# Altium footprint library Tienanh.PcbLib: 190 footprints (part 6 of 12)
Each footprint in its own frame and in the unit in brackets; x right, y up, seen from the top. Pads: shape width x height; smd on the part's side, far side on the other; paste and mask are expansions set on the pad; w line width, h text height; cw(c..) or ccw(c..) is an arc to the next point about the centre after c.
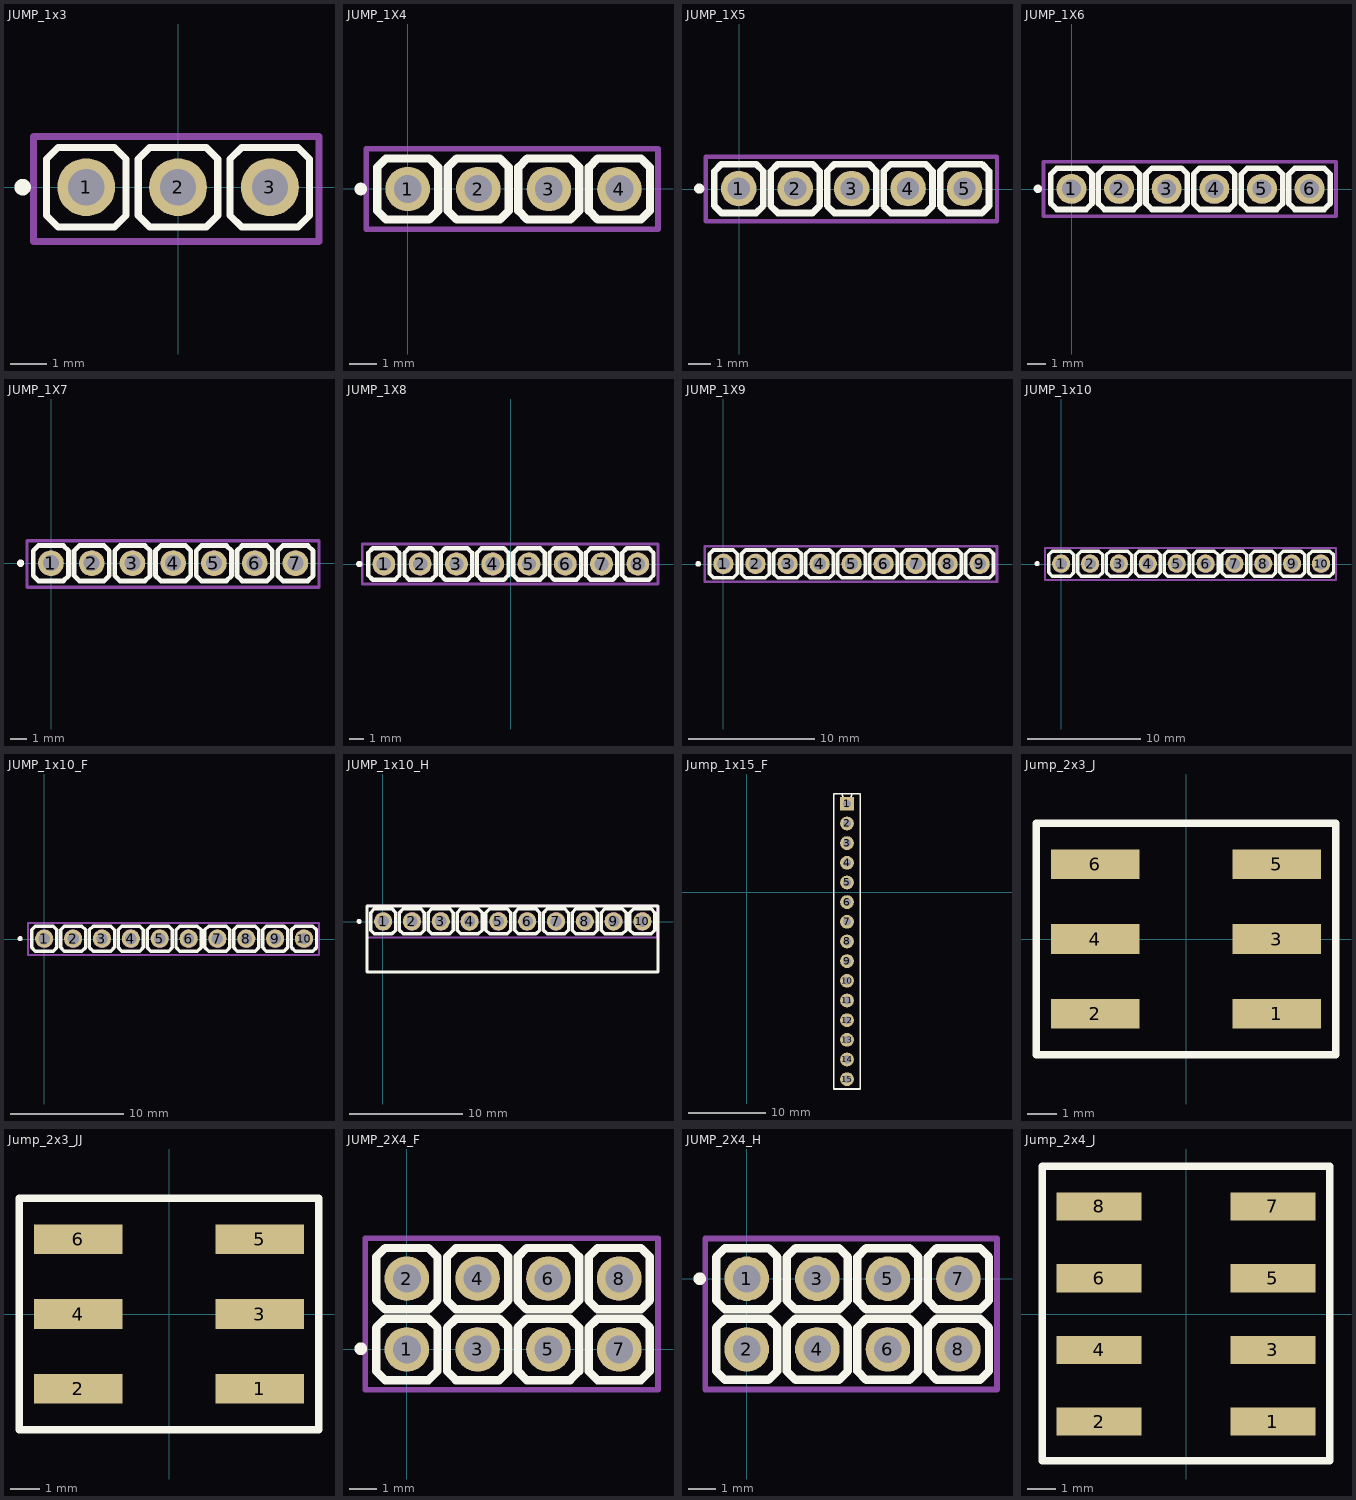
[diagram p5: the footprints below, top view; thin cyan lines are the x and y axes]

## JUMP_1x3 [mm] "JUMP_1x3_2P54"
pads (3):
  round 1.6 hole 1 mask+0.1: 1(-2.54,0) 2(0,0) 3(2.54,0)
Top Overlay:
  circle w0.254: c-4.3,0 r0.1
  lines w0.2: -3.64,-0.78 -3.32,-1.1 -1.76,-1.1 -1.44,-0.78 -1.44,0.78 -1.76,1.1 -3.32,1.1 -3.64,0.78 -3.64,-0.78 ; -1.1,-0.78 -0.78,-1.1 0.78,-1.1 1.1,-0.78 1.1,0.78 0.78,1.1 -0.78,1.1 -1.1,0.78 -1.1,-0.78 ; 1.44,-0.78 1.76,-1.1 3.32,-1.1 3.64,-0.78 3.64,0.78 3.32,1.1 1.76,1.1 1.44,0.78 1.44,-0.78
Mechanical 1:
  circle w0.05: c2.54,0 r0.762
  circle w0.05: c0,0 r0.762
  circle w0.05: c-2.54,0 r0.762
  lines w0.05: -3.64,-0.78 -3.64,0.78 -3.32,1.1 -1.76,1.1 -1.44,0.78 -1.44,-0.78 -1.76,-1.1 -3.32,-1.1 -3.64,-0.78 ; -1.1,-0.78 -1.1,0.78 -0.78,1.1 0.78,1.1 1.1,0.78 1.1,-0.78 0.78,-1.1 -0.78,-1.1 -1.1,-0.78 ; 1.44,-0.78 1.44,0.78 1.76,1.1 3.32,1.1 3.64,0.78 3.64,-0.78 3.32,-1.1 1.76,-1.1 1.44,-0.78
  text "1" at -2.64,-0.4 h0.8
  text "2" at -0.24,-0.4 h0.8
  text "3" at 2.26,-0.4 h0.8
Mechanical 15:
  lines w0.2: -4,-1.5 -4,1.4 3.9,1.4 3.9,-1.5 -4,-1.5
3D body "HEADER1.step": height 5.94, standoff -2.94, extent 1.24,-1.3 3.78,1.24
3D body "HEADER1.step": height 5.94, standoff -2.94, extent -1.3,-1.3 1.24,1.24
3D body "HEADER1.step": height 5.94, standoff -2.94, extent -3.84,-1.3 -1.3,1.24

## JUMP_1X4 [mm] "JUMP_1X4_2P54"
pads (4):
  round 1.6 hole 1 mask+0.1: 1(-0.01,-0.01) 2(2.53,-0.01) 3(5.07,-0.01) 4(7.61,-0.01)
Top Overlay:
  circle w0.254: c-1.7,-0.01 r0.1
  lines w0.3: -1.11,-0.79 -0.79,-1.11 0.77,-1.11 1.09,-0.79 1.09,0.77 0.77,1.09 -0.79,1.09 -1.11,0.77 -1.11,-0.79 ; 1.43,-0.79 1.75,-1.11 3.31,-1.11 3.63,-0.79 3.63,0.77 3.31,1.09 1.75,1.09 1.43,0.77 1.43,-0.79 ; 3.97,-0.79 4.29,-1.11 5.85,-1.11 6.17,-0.79 6.17,0.77 5.85,1.09 4.29,1.09 3.97,0.77 3.97,-0.79 ; 6.51,-0.79 6.83,-1.11 8.39,-1.11 8.71,-0.79 8.71,0.77 8.39,1.09 6.83,1.09 6.51,0.77 6.51,-0.79
Mechanical 1:
  circle w0.05: c7.61,-0.01 r0.762
  circle w0.05: c5.07,-0.01 r0.762
  circle w0.05: c2.53,-0.01 r0.762
  circle w0.05: c-0.01,-0.01 r0.762
  lines w0.05: -1.11,-0.79 -1.11,0.77 -0.79,1.09 0.77,1.09 1.09,0.77 1.09,-0.79 0.77,-1.11 -0.79,-1.11 -1.11,-0.79 ; 1.43,-0.79 1.43,0.77 1.75,1.09 3.31,1.09 3.63,0.77 3.63,-0.79 3.31,-1.11 1.75,-1.11 1.43,-0.79 ; 3.97,-0.79 3.97,0.77 4.29,1.09 5.85,1.09 6.17,0.77 6.17,-0.79 5.85,-1.11 4.29,-1.11 3.97,-0.79 ; 6.51,-0.79 6.51,0.77 6.83,1.09 8.39,1.09 8.71,0.77 8.71,-0.79 8.39,-1.11 6.83,-1.11 6.51,-0.79
  text "4" at 7.32,-0.37 h0.8
  text "3" at 4.82,-0.37 h0.8
  text "2" at 2.22,-0.37 h0.8
  text "1" at -0.18,-0.37 h0.8
Mechanical 15:
  lines w0.2: -1.5,-1.46 9,-1.46 9,1.44 -1.5,1.44 -1.5,-1.46
3D body "HEADER1.step": height 5.94, standoff -2.94, extent -1.31,-1.31 1.23,1.23
3D body "HEADER1.step": height 5.94, standoff -2.94, extent 1.23,-1.31 3.77,1.23
3D body "HEADER1.step": height 5.94, standoff -2.94, extent 6.31,-1.31 8.85,1.23
3D body "HEADER1.step": height 5.94, standoff -2.94, extent 3.77,-1.31 6.31,1.23

## JUMP_1X5 [mm] "JUMP_1X5_2P54"
pads (5):
  round 1.6 hole 1 mask+0.1: 1(-0.02,0.02) 2(2.52,0.02) 3(5.06,0.02) 4(7.6,0.02) 5(10.14,0.02)
Top Overlay:
  circle w0.254: c-1.8,0.02 r0.1
  lines w0.3: -1.12,-0.76 -1.12,0.8 -0.8,1.12 0.76,1.12 1.08,0.8 1.08,-0.76 0.76,-1.08 -0.8,-1.08 -1.12,-0.76 ; 1.42,-0.76 1.42,0.8 1.74,1.12 3.3,1.12 3.62,0.8 3.62,-0.76 3.3,-1.08 1.74,-1.08 1.42,-0.76 ; 3.96,-0.76 3.96,0.8 4.28,1.12 5.84,1.12 6.16,0.8 6.16,-0.76 5.84,-1.08 4.28,-1.08 3.96,-0.76 ; 6.5,-0.76 6.5,0.8 6.82,1.12 8.38,1.12 8.7,0.8 8.7,-0.76 8.38,-1.08 6.82,-1.08 6.5,-0.76 ; 9.04,-0.76 9.04,0.8 9.36,1.12 10.92,1.12 11.24,0.8 11.24,-0.76 10.92,-1.08 9.36,-1.08 9.04,-0.76
Mechanical 1:
  circle w0.05: c-0.02,0.02 r0.762
  circle w0.05: c2.52,0.02 r0.762
  circle w0.05: c5.06,0.02 r0.762
  circle w0.05: c7.6,0.02 r0.762
  circle w0.05: c10.14,0.02 r0.762
  lines w0.05: -1.12,-0.76 -0.8,-1.08 0.76,-1.08 1.08,-0.76 1.08,0.8 0.76,1.12 -0.8,1.12 -1.12,0.8 -1.12,-0.76 ; 1.42,-0.76 1.74,-1.08 3.3,-1.08 3.62,-0.76 3.62,0.8 3.3,1.12 1.74,1.12 1.42,0.8 1.42,-0.76 ; 3.96,-0.76 4.28,-1.08 5.84,-1.08 6.16,-0.76 6.16,0.8 5.84,1.12 4.28,1.12 3.96,0.8 3.96,-0.76 ; 6.5,-0.76 6.82,-1.08 8.38,-1.08 8.7,-0.76 8.7,0.8 8.38,1.12 6.82,1.12 6.5,0.8 6.5,-0.76 ; 9.04,-0.76 9.36,-1.08 10.92,-1.08 11.24,-0.76 11.24,0.8 10.92,1.12 9.36,1.12 9.04,0.8 9.04,-0.76
  text "4" at 7.26,-0.38 h0.8
  text "3" at 4.86,-0.38 h0.8
  text "2" at 2.28,-0.38 h0.8
  text "1" at -0.12,-0.38 h0.8
  text "5" at 9.88,-0.38 h0.8
Mechanical 15:
  lines w0.2: -1.5,-1.45 11.6,-1.45 11.6,1.45 -1.5,1.45 -1.5,-1.45
3D body "HEADER1.step": height 5.94, standoff -2.94, extent -1.32,-1.28 1.22,1.26
3D body "HEADER1.step": height 5.94, standoff -2.94, extent 1.22,-1.28 3.76,1.26
3D body "HEADER1.step": height 5.94, standoff -2.94, extent 3.76,-1.28 6.3,1.26
3D body "HEADER1.step": height 5.94, standoff -2.94, extent 6.3,-1.28 8.84,1.26
3D body "HEADER1.step": height 5.94, standoff -2.94, extent 8.84,-1.28 11.38,1.26

## JUMP_1X6 [mm] "JUMP_1X6_2P54"
pads (6):
  round 1.6 hole 1 mask+0.1: 1(-0.01,0.01) 2(2.53,0.01) 3(5.07,0.01) 4(7.61,0.01) 5(10.15,0.01) 6(12.69,0.01)
Top Overlay:
  circle w0.254: c-1.8,0.01 r0.1
  lines w0.3: -1.11,-0.77 -1.11,0.79 -0.79,1.11 0.77,1.11 1.09,0.79 1.09,-0.77 0.77,-1.09 -0.79,-1.09 -1.11,-0.77 ; 1.43,-0.77 1.43,0.79 1.75,1.11 3.31,1.11 3.63,0.79 3.63,-0.77 3.31,-1.09 1.75,-1.09 1.43,-0.77 ; 3.97,-0.77 3.97,0.79 4.29,1.11 5.85,1.11 6.17,0.79 6.17,-0.77 5.85,-1.09 4.29,-1.09 3.97,-0.77 ; 6.51,-0.77 6.51,0.79 6.83,1.11 8.39,1.11 8.71,0.79 8.71,-0.77 8.39,-1.09 6.83,-1.09 6.51,-0.77 ; 9.05,-0.77 9.05,0.79 9.37,1.11 10.93,1.11 11.25,0.79 11.25,-0.77 10.93,-1.09 9.37,-1.09 9.05,-0.77 ; 11.59,-0.77 11.59,0.79 11.91,1.11 13.47,1.11 13.79,0.79 13.79,-0.77 13.47,-1.09 11.91,-1.09 11.59,-0.77
Mechanical 1:
  circle w0.05: c12.69,0.01 r0.762
  circle w0.05: c10.15,0.01 r0.762
  circle w0.05: c7.61,0.01 r0.762
  circle w0.05: c5.07,0.01 r0.762
  circle w0.05: c2.53,0.01 r0.762
  circle w0.05: c-0.01,0.01 r0.762
  lines w0.05: -1.11,-0.77 -0.79,-1.09 0.77,-1.09 1.09,-0.77 1.09,0.79 0.77,1.11 -0.79,1.11 -1.11,0.79 -1.11,-0.77 ; 1.43,-0.77 1.75,-1.09 3.31,-1.09 3.63,-0.77 3.63,0.79 3.31,1.11 1.75,1.11 1.43,0.79 1.43,-0.77 ; 3.97,-0.77 4.29,-1.09 5.85,-1.09 6.17,-0.77 6.17,0.79 5.85,1.11 4.29,1.11 3.97,0.79 3.97,-0.77 ; 6.51,-0.77 6.83,-1.09 8.39,-1.09 8.71,-0.77 8.71,0.79 8.39,1.11 6.83,1.11 6.51,0.79 6.51,-0.77 ; 9.05,-0.77 9.37,-1.09 10.93,-1.09 11.25,-0.77 11.25,0.79 10.93,1.11 9.37,1.11 9.05,0.79 9.05,-0.77 ; 11.59,-0.77 11.91,-1.09 13.47,-1.09 13.79,-0.77 13.79,0.79 13.47,1.11 11.91,1.11 11.59,0.79 11.59,-0.77
  text "5" at 9.91,-0.36 h0.8
  text "1" at -0.17,-0.36 h0.8
  text "2" at 2.23,-0.36 h0.8
  text "3" at 4.81,-0.36 h0.8
  text "4" at 7.31,-0.36 h0.8
  text "6" at 12.38,-0.41 h0.8
Mechanical 15:
  lines w0.2: -1.5,-1.45 -1.5,1.45 14.1,1.45 14.1,-1.45 -1.5,-1.45
3D body "HEADER1.step": height 5.94, standoff -2.94, extent 11.39,-1.29 13.93,1.25
3D body "HEADER1.step": height 5.94, standoff -2.94, extent 8.85,-1.29 11.39,1.25
3D body "HEADER1.step": height 5.94, standoff -2.94, extent 6.31,-1.29 8.85,1.25
3D body "HEADER1.step": height 5.94, standoff -2.94, extent 3.77,-1.29 6.31,1.25
3D body "HEADER1.step": height 5.94, standoff -2.94, extent 1.23,-1.29 3.77,1.25
3D body "HEADER1.step": height 5.94, standoff -2.94, extent -1.31,-1.29 1.23,1.25

## JUMP_1X7 [mm] "JUMP_1X7_2P54"
pads (7):
  round 1.6 hole 1 mask+0.1: 1(-0.01,0) 2(2.53,0) 3(5.07,0) 4(7.61,0) 5(10.15,0) 6(12.69,0) 7(15.23,0)
Top Overlay:
  circle w0.254: c-1.9,0 r0.1
  lines w0.3: -1.11,-0.78 -1.11,0.78 -0.79,1.1 0.77,1.1 1.09,0.78 1.09,-0.78 0.77,-1.1 -0.79,-1.1 -1.11,-0.78 ; 1.43,-0.78 1.43,0.78 1.75,1.1 3.31,1.1 3.63,0.78 3.63,-0.78 3.31,-1.1 1.75,-1.1 1.43,-0.78 ; 3.97,-0.78 3.97,0.78 4.29,1.1 5.85,1.1 6.17,0.78 6.17,-0.78 5.85,-1.1 4.29,-1.1 3.97,-0.78 ; 6.51,-0.78 6.51,0.78 6.83,1.1 8.39,1.1 8.71,0.78 8.71,-0.78 8.39,-1.1 6.83,-1.1 6.51,-0.78 ; 9.05,-0.78 9.05,0.78 9.37,1.1 10.93,1.1 11.25,0.78 11.25,-0.78 10.93,-1.1 9.37,-1.1 9.05,-0.78 ; 11.59,-0.78 11.59,0.78 11.91,1.1 13.47,1.1 13.79,0.78 13.79,-0.78 13.47,-1.1 11.91,-1.1 11.59,-0.78 ; 14.13,-0.78 14.13,0.78 14.45,1.1 16.01,1.1 16.33,0.78 16.33,-0.78 16.01,-1.1 14.45,-1.1 14.13,-0.78
Mechanical 1:
  circle w0.05: c-0.01,0 r0.762
  circle w0.05: c2.53,0 r0.762
  circle w0.05: c5.07,0 r0.762
  circle w0.05: c7.61,0 r0.762
  circle w0.05: c10.15,0 r0.762
  circle w0.05: c12.69,0 r0.762
  circle w0.05: c15.23,0 r0.762
  lines w0.05: -1.11,-0.78 -0.79,-1.1 0.77,-1.1 1.09,-0.78 1.09,0.78 0.77,1.1 -0.79,1.1 -1.11,0.78 -1.11,-0.78 ; 1.43,-0.78 1.75,-1.1 3.31,-1.1 3.63,-0.78 3.63,0.78 3.31,1.1 1.75,1.1 1.43,0.78 1.43,-0.78 ; 3.97,-0.78 4.29,-1.1 5.85,-1.1 6.17,-0.78 6.17,0.78 5.85,1.1 4.29,1.1 3.97,0.78 3.97,-0.78 ; 6.51,-0.78 6.83,-1.1 8.39,-1.1 8.71,-0.78 8.71,0.78 8.39,1.1 6.83,1.1 6.51,0.78 6.51,-0.78 ; 9.05,-0.78 9.37,-1.1 10.93,-1.1 11.25,-0.78 11.25,0.78 10.93,1.1 9.37,1.1 9.05,0.78 9.05,-0.78 ; 11.59,-0.78 11.91,-1.1 13.47,-1.1 13.79,-0.78 13.79,0.78 13.47,1.1 11.91,1.1 11.59,0.78 11.59,-0.78 ; 14.13,-0.78 14.45,-1.1 16.01,-1.1 16.33,-0.78 16.33,0.78 16.01,1.1 14.45,1.1 14.13,0.78 14.13,-0.78
  text "7" at 15.05,-0.5 h0.8
  text "5" at 9.95,-0.4 h0.8
  text "1" at -0.13,-0.4 h0.8
  text "2" at 2.27,-0.4 h0.8
  text "3" at 4.85,-0.4 h0.8
  text "4" at 7.35,-0.4 h0.8
  text "6" at 12.42,-0.45 h0.8
Mechanical 15:
  lines w0.2: -1.5,-1.5 16.7,-1.5 16.7,1.4 -1.5,1.4 -1.5,-1.5
3D body "HEADER1.step": height 5.94, standoff -2.94, extent -1.31,-1.3 1.23,1.24
3D body "HEADER1.step": height 5.94, standoff -2.94, extent 1.23,-1.3 3.77,1.24
3D body "HEADER1.step": height 5.94, standoff -2.94, extent 3.77,-1.3 6.31,1.24
3D body "HEADER1.step": height 5.94, standoff -2.94, extent 6.31,-1.3 8.85,1.24
3D body "HEADER1.step": height 5.94, standoff -2.94, extent 8.85,-1.3 11.39,1.24
3D body "HEADER1.step": height 5.94, standoff -2.94, extent 11.39,-1.3 13.93,1.24
3D body "HEADER1.step": height 5.94, standoff -2.94, extent 13.93,-1.3 16.47,1.24

## JUMP_1X8 [mm] "JUMP_1X8_2P54"
pads (8):
  round 1.6 hole 1 mask+0.1: 1(-8.89,0) 2(-6.35,0) 3(-3.81,0) 4(-1.27,0) 5(1.27,0) 6(3.81,0) 7(6.35,0) 8(8.89,0)
Top Overlay:
  circle w0.254: c-10.6,0 r0.1
  lines w0.3: -9.99,-0.78 -9.99,0.78 -9.67,1.1 -8.11,1.1 -7.79,0.78 -7.79,-0.78 -8.11,-1.1 -9.67,-1.1 -9.99,-0.78 ; -7.45,-0.78 -7.45,0.78 -7.13,1.1 -5.57,1.1 -5.25,0.78 -5.25,-0.78 -5.57,-1.1 -7.13,-1.1 -7.45,-0.78 ; -4.91,-0.78 -4.91,0.78 -4.59,1.1 -3.03,1.1 -2.71,0.78 -2.71,-0.78 -3.03,-1.1 -4.59,-1.1 -4.91,-0.78 ; -2.37,-0.78 -2.37,0.78 -2.05,1.1 -0.49,1.1 -0.17,0.78 -0.17,-0.78 -0.49,-1.1 -2.05,-1.1 -2.37,-0.78 ; 0.17,-0.78 0.17,0.78 0.49,1.1 2.05,1.1 2.37,0.78 2.37,-0.78 2.05,-1.1 0.49,-1.1 0.17,-0.78 ; 2.71,-0.78 2.71,0.78 3.03,1.1 4.59,1.1 4.91,0.78 4.91,-0.78 4.59,-1.1 3.03,-1.1 2.71,-0.78 ; 5.25,-0.78 5.25,0.78 5.57,1.1 7.13,1.1 7.45,0.78 7.45,-0.78 7.13,-1.1 5.57,-1.1 5.25,-0.78 ; 7.79,-0.78 7.79,0.78 8.11,1.1 9.67,1.1 9.99,0.78 9.99,-0.78 9.67,-1.1 8.11,-1.1 7.79,-0.78
Mechanical 1:
  circle w0.05: c8.89,0 r0.762
  circle w0.05: c6.35,0 r0.762
  circle w0.05: c3.81,0 r0.762
  circle w0.05: c1.27,0 r0.762
  circle w0.05: c-1.27,0 r0.762
  circle w0.05: c-3.81,0 r0.762
  circle w0.05: c-6.35,0 r0.762
  circle w0.05: c-8.89,0 r0.762
  lines w0.05: -9.99,-0.78 -9.67,-1.1 -8.11,-1.1 -7.79,-0.78 -7.79,0.78 -8.11,1.1 -9.67,1.1 -9.99,0.78 -9.99,-0.78 ; -7.45,-0.78 -7.13,-1.1 -5.57,-1.1 -5.25,-0.78 -5.25,0.78 -5.57,1.1 -7.13,1.1 -7.45,0.78 -7.45,-0.78 ; -4.91,-0.78 -4.59,-1.1 -3.03,-1.1 -2.71,-0.78 -2.71,0.78 -3.03,1.1 -4.59,1.1 -4.91,0.78 -4.91,-0.78 ; -2.37,-0.78 -2.05,-1.1 -0.49,-1.1 -0.17,-0.78 -0.17,0.78 -0.49,1.1 -2.05,1.1 -2.37,0.78 -2.37,-0.78 ; 0.17,-0.78 0.49,-1.1 2.05,-1.1 2.37,-0.78 2.37,0.78 2.05,1.1 0.49,1.1 0.17,0.78 0.17,-0.78 ; 2.71,-0.78 3.03,-1.1 4.59,-1.1 4.91,-0.78 4.91,0.78 4.59,1.1 3.03,1.1 2.71,0.78 2.71,-0.78 ; 5.25,-0.78 5.57,-1.1 7.13,-1.1 7.45,-0.78 7.45,0.78 7.13,1.1 5.57,1.1 5.25,0.78 5.25,-0.78 ; 7.79,-0.78 8.11,-1.1 9.67,-1.1 9.99,-0.78 9.99,0.78 9.67,1.1 8.11,1.1 7.79,0.78 7.79,-0.78
  text "6" at 3.54,-0.45 h0.8
  text "4" at -1.53,-0.4 h0.8
  text "3" at -4.03,-0.4 h0.8
  text "2" at -6.61,-0.4 h0.8
  text "1" at -9.01,-0.4 h0.8
  text "5" at 1.07,-0.4 h0.8
  text "7" at 6.17,-0.45 h0.8
  text "8" at 8.57,-0.5 h0.8
Mechanical 15:
  lines w0.2: -10.4,-1.4 -10.4,1.4 10.3,1.4 10.3,-1.4 -10.4,-1.4
3D body "HEADER1.step": height 5.94, standoff -2.94, extent 7.59,-1.3 10.13,1.24
3D body "HEADER1.step": height 5.94, standoff -2.94, extent 5.05,-1.3 7.59,1.24
3D body "HEADER1.step": height 5.94, standoff -2.94, extent 2.51,-1.3 5.05,1.24
3D body "HEADER1.step": height 5.94, standoff -2.94, extent -0.03,-1.3 2.51,1.24
3D body "HEADER1.step": height 5.94, standoff -2.94, extent -2.57,-1.3 -0.03,1.24
3D body "HEADER1.step": height 5.94, standoff -2.94, extent -5.11,-1.3 -2.57,1.24
3D body "HEADER1.step": height 5.94, standoff -2.94, extent -7.65,-1.3 -5.11,1.24
3D body "HEADER1.step": height 5.94, standoff -2.94, extent -10.19,-1.3 -7.65,1.24

## JUMP_1X9 [mm] "JUMP_1X9_2P54"
pads (9):
  round 1.6 hole 1 mask+0.1: 1(0,0.01) 2(2.54,0.01) 3(5.08,0.01) 4(7.62,0.01) 5(10.16,0.01) 6(12.7,0.01) 7(15.24,0.01) 8(17.78,0.01) 9(20.32,0.01)
Top Overlay:
  circle w0.254: c-2,0.01 r0.1
  lines w0.3: -1.1,-0.77 -1.1,0.79 -0.78,1.11 0.78,1.11 1.1,0.79 1.1,-0.77 0.78,-1.09 -0.78,-1.09 -1.1,-0.77 ; 1.44,-0.77 1.44,0.79 1.76,1.11 3.32,1.11 3.64,0.79 3.64,-0.77 3.32,-1.09 1.76,-1.09 1.44,-0.77 ; 3.98,-0.77 3.98,0.79 4.3,1.11 5.86,1.11 6.18,0.79 6.18,-0.77 5.86,-1.09 4.3,-1.09 3.98,-0.77 ; 6.52,-0.77 6.52,0.79 6.84,1.11 8.4,1.11 8.72,0.79 8.72,-0.77 8.4,-1.09 6.84,-1.09 6.52,-0.77 ; 9.06,-0.77 9.06,0.79 9.38,1.11 10.94,1.11 11.26,0.79 11.26,-0.77 10.94,-1.09 9.38,-1.09 9.06,-0.77 ; 11.6,-0.77 11.6,0.79 11.92,1.11 13.48,1.11 13.8,0.79 13.8,-0.77 13.48,-1.09 11.92,-1.09 11.6,-0.77 ; 14.14,-0.77 14.14,0.79 14.46,1.11 16.02,1.11 16.34,0.79 16.34,-0.77 16.02,-1.09 14.46,-1.09 14.14,-0.77 ; 16.68,-0.77 16.68,0.79 17,1.11 18.56,1.11 18.88,0.79 18.88,-0.77 18.56,-1.09 17,-1.09 16.68,-0.77 ; 19.22,-0.77 19.22,0.79 19.54,1.11 21.1,1.11 21.42,0.79 21.42,-0.77 21.1,-1.09 19.54,-1.09 19.22,-0.77
Mechanical 1:
  circle w0.05: c0,0.01 r0.762
  circle w0.05: c2.54,0.01 r0.762
  circle w0.05: c5.08,0.01 r0.762
  circle w0.05: c7.62,0.01 r0.762
  circle w0.05: c10.16,0.01 r0.762
  circle w0.05: c12.7,0.01 r0.762
  circle w0.05: c15.24,0.01 r0.762
  circle w0.05: c17.78,0.01 r0.762
  circle w0.05: c20.32,0.01 r0.762
  lines w0.05: -1.1,-0.77 -0.78,-1.09 0.78,-1.09 1.1,-0.77 1.1,0.79 0.78,1.11 -0.78,1.11 -1.1,0.79 -1.1,-0.77 ; 1.44,-0.77 1.76,-1.09 3.32,-1.09 3.64,-0.77 3.64,0.79 3.32,1.11 1.76,1.11 1.44,0.79 1.44,-0.77 ; 3.98,-0.77 4.3,-1.09 5.86,-1.09 6.18,-0.77 6.18,0.79 5.86,1.11 4.3,1.11 3.98,0.79 3.98,-0.77 ; 6.52,-0.77 6.84,-1.09 8.4,-1.09 8.72,-0.77 8.72,0.79 8.4,1.11 6.84,1.11 6.52,0.79 6.52,-0.77 ; 9.06,-0.77 9.38,-1.09 10.94,-1.09 11.26,-0.77 11.26,0.79 10.94,1.11 9.38,1.11 9.06,0.79 9.06,-0.77 ; 11.6,-0.77 11.92,-1.09 13.48,-1.09 13.8,-0.77 13.8,0.79 13.48,1.11 11.92,1.11 11.6,0.79 11.6,-0.77 ; 14.14,-0.77 14.46,-1.09 16.02,-1.09 16.34,-0.77 16.34,0.79 16.02,1.11 14.46,1.11 14.14,0.79 14.14,-0.77 ; 16.68,-0.77 17,-1.09 18.56,-1.09 18.88,-0.77 18.88,0.79 18.56,1.11 17,1.11 16.68,0.79 16.68,-0.77 ; 19.22,-0.77 19.54,-1.09 21.1,-1.09 21.42,-0.77 21.42,0.79 21.1,1.11 19.54,1.11 19.22,0.79 19.22,-0.77
  text "7" at 15.06,-0.49 h0.8
  text "5" at 9.96,-0.39 h0.8
  text "1" at -0.12,-0.39 h0.8
  text "2" at 2.28,-0.39 h0.8
  text "3" at 4.86,-0.39 h0.8
  text "4" at 7.36,-0.39 h0.8
  text "6" at 12.43,-0.44 h0.8
  text "8" at 17.46,-1.49 h0.8
  text "9" at 20.06,-0.39 h0.8
Mechanical 15:
  lines w0.2: -1.5,-1.4 -1.5,1.4 21.7,1.4 21.7,-1.4 -1.5,-1.4
3D body "HEADER1.step": height 5.94, standoff -2.94, extent -1.3,-1.29 1.24,1.25
3D body "HEADER1.step": height 5.94, standoff -2.94, extent 1.24,-1.29 3.78,1.25
3D body "HEADER1.step": height 5.94, standoff -2.94, extent 3.78,-1.29 6.32,1.25
3D body "HEADER1.step": height 5.94, standoff -2.94, extent 6.32,-1.29 8.86,1.25
3D body "HEADER1.step": height 5.94, standoff -2.94, extent 8.86,-1.29 11.4,1.25
3D body "HEADER1.step": height 5.94, standoff -2.94, extent 11.4,-1.29 13.94,1.25
3D body "HEADER1.step": height 5.94, standoff -2.94, extent 13.94,-1.29 16.48,1.25
3D body "HEADER1.step": height 5.94, standoff -2.94, extent 16.48,-1.29 19.02,1.25
3D body "HEADER1.step": height 5.94, standoff -2.94, extent 19.02,-1.29 21.56,1.25

## JUMP_1x10 [mm] "JUMP_1x10_2P54"
pads (10):
  round 1.6 hole 1 mask+0.1: 1(0.02,0.03) 2(2.56,0.03) 3(5.1,0.03) 4(7.64,0.03) 5(10.18,0.03) 6(12.72,0.03) 7(15.26,0.03) 8(17.8,0.03) 9(20.34,0.03) 10(22.88,0.03)
Top Overlay:
  circle w0.254: c-2.1,0.03 r0.1
  lines w0.3: -1.08,-0.75 -1.08,0.81 -0.76,1.13 0.8,1.13 1.12,0.81 1.12,-0.75 0.8,-1.07 -0.76,-1.07 -1.08,-0.75 ; 1.46,-0.75 1.46,0.81 1.78,1.13 3.34,1.13 3.66,0.81 3.66,-0.75 3.34,-1.07 1.78,-1.07 1.46,-0.75 ; 4,-0.75 4,0.81 4.32,1.13 5.88,1.13 6.2,0.81 6.2,-0.75 5.88,-1.07 4.32,-1.07 4,-0.75 ; 6.54,-0.75 6.54,0.81 6.86,1.13 8.42,1.13 8.74,0.81 8.74,-0.75 8.42,-1.07 6.86,-1.07 6.54,-0.75 ; 9.08,-0.75 9.08,0.81 9.4,1.13 10.96,1.13 11.28,0.81 11.28,-0.75 10.96,-1.07 9.4,-1.07 9.08,-0.75 ; 11.62,-0.75 11.62,0.81 11.94,1.13 13.5,1.13 13.82,0.81 13.82,-0.75 13.5,-1.07 11.94,-1.07 11.62,-0.75 ; 14.16,-0.75 14.16,0.81 14.48,1.13 16.04,1.13 16.36,0.81 16.36,-0.75 16.04,-1.07 14.48,-1.07 14.16,-0.75 ; 16.7,-0.75 16.7,0.81 17.02,1.13 18.58,1.13 18.9,0.81 18.9,-0.75 18.58,-1.07 17.02,-1.07 16.7,-0.75 ; 19.24,-0.75 19.24,0.81 19.56,1.13 21.12,1.13 21.44,0.81 21.44,-0.75 21.12,-1.07 19.56,-1.07 19.24,-0.75 ; 21.78,-0.75 21.78,0.81 22.1,1.13 23.66,1.13 23.98,0.81 23.98,-0.75 23.66,-1.07 22.1,-1.07 21.78,-0.75
Mechanical 1:
  circle w0.05: c22.88,0.03 r0.762
  circle w0.05: c20.34,0.03 r0.762
  circle w0.05: c17.8,0.03 r0.762
  circle w0.05: c15.26,0.03 r0.762
  circle w0.05: c12.72,0.03 r0.762
  circle w0.05: c10.18,0.03 r0.762
  circle w0.05: c7.64,0.03 r0.762
  circle w0.05: c5.1,0.03 r0.762
  circle w0.05: c2.56,0.03 r0.762
  circle w0.05: c0.02,0.03 r0.762
  lines w0.05: -1.08,-0.75 -0.76,-1.07 0.8,-1.07 1.12,-0.75 1.12,0.81 0.8,1.13 -0.76,1.13 -1.08,0.81 ; 1.46,-0.75 1.78,-1.07 3.34,-1.07 3.66,-0.75 3.66,0.81 3.34,1.13 1.78,1.13 1.46,0.81 1.46,-0.75 ; 4,-0.75 4.32,-1.07 5.88,-1.07 6.2,-0.75 6.2,0.81 5.88,1.13 4.32,1.13 4,0.81 4,-0.75 ; 6.54,-0.75 6.86,-1.07 8.42,-1.07 8.74,-0.75 8.74,0.81 8.42,1.13 6.86,1.13 6.54,0.81 6.54,-0.75 ; 9.08,-0.75 9.4,-1.07 10.96,-1.07 11.28,-0.75 11.28,0.81 10.96,1.13 9.4,1.13 9.08,0.81 9.08,-0.75 ; 11.62,-0.75 11.94,-1.07 13.5,-1.07 13.82,-0.75 13.82,0.81 13.5,1.13 11.94,1.13 11.62,0.81 11.62,-0.75 ; 14.16,-0.75 14.48,-1.07 16.04,-1.07 16.36,-0.75 16.36,0.81 16.04,1.13 14.48,1.13 14.16,0.81 14.16,-0.75 ; 16.7,-0.75 17.02,-1.07 18.58,-1.07 18.9,-0.75 18.9,0.81 18.58,1.13 17.02,1.13 16.7,0.81 16.7,-0.75 ; 19.24,-0.75 19.56,-1.07 21.12,-1.07 21.44,-0.75 21.44,0.81 21.12,1.13 19.56,1.13 19.24,0.81 19.24,-0.75 ; 21.78,-0.75 22.1,-1.07 23.66,-1.07 23.98,-0.75 23.98,0.81 23.66,1.13 22.1,1.13 21.78,0.81 21.78,-0.75
  text "7" at 15.08,-0.47 h0.8
  text "5" at 9.98,-0.37 h0.8
  text "1" at -0.1,-0.37 h0.8
  text "2" at 2.3,-0.37 h0.8
  text "3" at 4.88,-0.37 h0.8
  text "4" at 7.38,-0.37 h0.8
  text "6" at 12.45,-0.42 h0.8
  text "9" at 20.08,-0.47 h0.8
  text "8" at 17.48,-1.57 h0.8
  text "10" at 22.38,-0.27 h0.6
Mechanical 15:
  lines w0.2: -1.4,-1.4 -1.4,1.4 24.2,1.4 24.2,-1.4 -1.4,-1.4
3D body "HEADER1.step": height 5.94, standoff -2.94, extent 21.58,-1.27 24.12,1.27
3D body "HEADER1.step": height 5.94, standoff -2.94, extent 19.04,-1.27 21.58,1.27
3D body "HEADER1.step": height 5.94, standoff -2.94, extent 16.5,-1.27 19.04,1.27
3D body "HEADER1.step": height 5.94, standoff -2.94, extent 13.96,-1.27 16.5,1.27
3D body "HEADER1.step": height 5.94, standoff -2.94, extent 11.42,-1.27 13.96,1.27
3D body "HEADER1.step": height 5.94, standoff -2.94, extent 8.88,-1.27 11.42,1.27
3D body "HEADER1.step": height 5.94, standoff -2.94, extent 6.34,-1.27 8.88,1.27
3D body "HEADER1.step": height 5.94, standoff -2.94, extent 3.8,-1.27 6.34,1.27
3D body "HEADER1.step": height 5.94, standoff -2.94, extent 1.26,-1.27 3.8,1.27
3D body "HEADER1.step": height 5.94, standoff -2.94, extent -1.28,-1.27 1.26,1.27

## JUMP_1x10_F [mm] "JUMP_1x10_2P54"
pads (10):
  round 1.6 hole 1 mask+0.1: 1(0.02,0.03) 2(2.56,0.03) 3(5.1,0.03) 4(7.64,0.03) 5(10.18,0.03) 6(12.72,0.03) 7(15.26,0.03) 8(17.8,0.03) 9(20.34,0.03) 10(22.88,0.03)
Top Overlay:
  circle w0.254: c-2.1,0.03 r0.1
  lines w0.3: -1.08,-0.75 -0.76,-1.07 0.8,-1.07 1.12,-0.75 1.12,0.81 0.8,1.13 -0.76,1.13 -1.08,0.81 -1.08,-0.75 ; 1.46,-0.75 1.78,-1.07 3.34,-1.07 3.66,-0.75 3.66,0.81 3.34,1.13 1.78,1.13 1.46,0.81 1.46,-0.75 ; 4,-0.75 4.32,-1.07 5.88,-1.07 6.2,-0.75 6.2,0.81 5.88,1.13 4.32,1.13 4,0.81 4,-0.75 ; 6.54,-0.75 6.86,-1.07 8.42,-1.07 8.74,-0.75 8.74,0.81 8.42,1.13 6.86,1.13 6.54,0.81 6.54,-0.75 ; 9.08,-0.75 9.4,-1.07 10.96,-1.07 11.28,-0.75 11.28,0.81 10.96,1.13 9.4,1.13 9.08,0.81 9.08,-0.75 ; 11.62,-0.75 11.94,-1.07 13.5,-1.07 13.82,-0.75 13.82,0.81 13.5,1.13 11.94,1.13 11.62,0.81 11.62,-0.75 ; 14.16,-0.75 14.48,-1.07 16.04,-1.07 16.36,-0.75 16.36,0.81 16.04,1.13 14.48,1.13 14.16,0.81 14.16,-0.75 ; 16.7,-0.75 17.02,-1.07 18.58,-1.07 18.9,-0.75 18.9,0.81 18.58,1.13 17.02,1.13 16.7,0.81 16.7,-0.75 ; 19.24,-0.75 19.56,-1.07 21.12,-1.07 21.44,-0.75 21.44,0.81 21.12,1.13 19.56,1.13 19.24,0.81 19.24,-0.75 ; 21.78,-0.75 22.1,-1.07 23.66,-1.07 23.98,-0.75 23.98,0.81 23.66,1.13 22.1,1.13 21.78,0.81 21.78,-0.75
Mechanical 1:
  circle w0.05: c0.02,0.03 r0.762
  circle w0.05: c2.56,0.03 r0.762
  circle w0.05: c5.1,0.03 r0.762
  circle w0.05: c7.64,0.03 r0.762
  circle w0.05: c10.18,0.03 r0.762
  circle w0.05: c12.72,0.03 r0.762
  circle w0.05: c15.26,0.03 r0.762
  circle w0.05: c17.8,0.03 r0.762
  circle w0.05: c20.34,0.03 r0.762
  circle w0.05: c22.88,0.03 r0.762
  lines w0.05: -1.08,-0.75 -0.76,-1.07 0.8,-1.07 1.12,-0.75 1.12,0.81 0.8,1.13 -0.76,1.13 -1.08,0.81 ; 1.46,-0.75 1.46,0.81 1.78,1.13 3.34,1.13 3.66,0.81 3.66,-0.75 3.34,-1.07 1.78,-1.07 1.46,-0.75 ; 4,-0.75 4,0.81 4.32,1.13 5.88,1.13 6.2,0.81 6.2,-0.75 5.88,-1.07 4.32,-1.07 4,-0.75 ; 6.54,-0.75 6.54,0.81 6.86,1.13 8.42,1.13 8.74,0.81 8.74,-0.75 8.42,-1.07 6.86,-1.07 6.54,-0.75 ; 9.08,-0.75 9.08,0.81 9.4,1.13 10.96,1.13 11.28,0.81 11.28,-0.75 10.96,-1.07 9.4,-1.07 9.08,-0.75 ; 11.62,-0.75 11.62,0.81 11.94,1.13 13.5,1.13 13.82,0.81 13.82,-0.75 13.5,-1.07 11.94,-1.07 11.62,-0.75 ; 14.16,-0.75 14.16,0.81 14.48,1.13 16.04,1.13 16.36,0.81 16.36,-0.75 16.04,-1.07 14.48,-1.07 14.16,-0.75 ; 16.7,-0.75 16.7,0.81 17.02,1.13 18.58,1.13 18.9,0.81 18.9,-0.75 18.58,-1.07 17.02,-1.07 16.7,-0.75 ; 19.24,-0.75 19.24,0.81 19.56,1.13 21.12,1.13 21.44,0.81 21.44,-0.75 21.12,-1.07 19.56,-1.07 19.24,-0.75 ; 21.78,-0.75 21.78,0.81 22.1,1.13 23.66,1.13 23.98,0.81 23.98,-0.75 23.66,-1.07 22.1,-1.07 21.78,-0.75
  text "10" at 22.38,-0.27 h0.6
  text "8" at 17.48,-1.57 h0.8
  text "9" at 20.08,-0.47 h0.8
  text "6" at 12.45,-0.42 h0.8
  text "4" at 7.38,-0.37 h0.8
  text "3" at 4.88,-0.37 h0.8
  text "2" at 2.3,-0.37 h0.8
  text "1" at -0.1,-0.37 h0.8
  text "5" at 9.98,-0.37 h0.8
  text "7" at 15.08,-0.47 h0.8
Mechanical 15:
  lines w0.2: -1.4,-1.4 24.2,-1.4 24.2,1.4 -1.4,1.4 -1.4,-1.4
3D body "BG100-10-A-N-D.stp": height 7.1, standoff -3, extent -1.27,-1.23 24.13,1.27

## JUMP_1x10_H [mm] "JUMP_1x10_2P54"
pads (10):
  round 1.6 hole 1 mask+0.1: 1(0.02,0.03) 2(2.56,0.03) 3(5.1,0.03) 4(7.64,0.03) 5(10.18,0.03) 6(12.72,0.03) 7(15.26,0.03) 8(17.8,0.03) 9(20.34,0.03) 10(22.88,0.03)
Top Overlay:
  circle w0.254: c-2.1,0.03 r0.1
  lines w0.254: -1.397,-4.445 24.257,-4.445 24.257,1.397 -1.397,1.397 -1.397,-4.445
  lines w0.3: -1.08,-0.75 -1.08,0.81 -0.76,1.13 0.8,1.13 1.12,0.81 1.12,-0.75 0.8,-1.07 -0.76,-1.07 -1.08,-0.75 ; 1.46,-0.75 1.46,0.81 1.78,1.13 3.34,1.13 3.66,0.81 3.66,-0.75 3.34,-1.07 1.78,-1.07 1.46,-0.75 ; 4,-0.75 4,0.81 4.32,1.13 5.88,1.13 6.2,0.81 6.2,-0.75 5.88,-1.07 4.32,-1.07 4,-0.75 ; 6.54,-0.75 6.54,0.81 6.86,1.13 8.42,1.13 8.74,0.81 8.74,-0.75 8.42,-1.07 6.86,-1.07 6.54,-0.75 ; 9.08,-0.75 9.08,0.81 9.4,1.13 10.96,1.13 11.28,0.81 11.28,-0.75 10.96,-1.07 9.4,-1.07 9.08,-0.75 ; 11.62,-0.75 11.62,0.81 11.94,1.13 13.5,1.13 13.82,0.81 13.82,-0.75 13.5,-1.07 11.94,-1.07 11.62,-0.75 ; 14.16,-0.75 14.16,0.81 14.48,1.13 16.04,1.13 16.36,0.81 16.36,-0.75 16.04,-1.07 14.48,-1.07 14.16,-0.75 ; 16.7,-0.75 16.7,0.81 17.02,1.13 18.58,1.13 18.9,0.81 18.9,-0.75 18.58,-1.07 17.02,-1.07 16.7,-0.75 ; 19.24,-0.75 19.24,0.81 19.56,1.13 21.12,1.13 21.44,0.81 21.44,-0.75 21.12,-1.07 19.56,-1.07 19.24,-0.75 ; 21.78,-0.75 21.78,0.81 22.1,1.13 23.66,1.13 23.98,0.81 23.98,-0.75 23.66,-1.07 22.1,-1.07 21.78,-0.75
Mechanical 1:
  circle w0.05: c22.88,0.03 r0.762
  circle w0.05: c20.34,0.03 r0.762
  circle w0.05: c17.8,0.03 r0.762
  circle w0.05: c15.26,0.03 r0.762
  circle w0.05: c12.72,0.03 r0.762
  circle w0.05: c10.18,0.03 r0.762
  circle w0.05: c7.64,0.03 r0.762
  circle w0.05: c5.1,0.03 r0.762
  circle w0.05: c2.56,0.03 r0.762
  circle w0.05: c0.02,0.03 r0.762
  lines w0.05: -1.08,-0.75 -0.76,-1.07 0.8,-1.07 1.12,-0.75 1.12,0.81 0.8,1.13 -0.76,1.13 -1.08,0.81 ; 1.46,-0.75 1.78,-1.07 3.34,-1.07 3.66,-0.75 3.66,0.81 3.34,1.13 1.78,1.13 1.46,0.81 1.46,-0.75 ; 4,-0.75 4.32,-1.07 5.88,-1.07 6.2,-0.75 6.2,0.81 5.88,1.13 4.32,1.13 4,0.81 4,-0.75 ; 6.54,-0.75 6.86,-1.07 8.42,-1.07 8.74,-0.75 8.74,0.81 8.42,1.13 6.86,1.13 6.54,0.81 6.54,-0.75 ; 9.08,-0.75 9.4,-1.07 10.96,-1.07 11.28,-0.75 11.28,0.81 10.96,1.13 9.4,1.13 9.08,0.81 9.08,-0.75 ; 11.62,-0.75 11.94,-1.07 13.5,-1.07 13.82,-0.75 13.82,0.81 13.5,1.13 11.94,1.13 11.62,0.81 11.62,-0.75 ; 14.16,-0.75 14.48,-1.07 16.04,-1.07 16.36,-0.75 16.36,0.81 16.04,1.13 14.48,1.13 14.16,0.81 14.16,-0.75 ; 16.7,-0.75 17.02,-1.07 18.58,-1.07 18.9,-0.75 18.9,0.81 18.58,1.13 17.02,1.13 16.7,0.81 16.7,-0.75 ; 19.24,-0.75 19.56,-1.07 21.12,-1.07 21.44,-0.75 21.44,0.81 21.12,1.13 19.56,1.13 19.24,0.81 19.24,-0.75 ; 21.78,-0.75 22.1,-1.07 23.66,-1.07 23.98,-0.75 23.98,0.81 23.66,1.13 22.1,1.13 21.78,0.81 21.78,-0.75
  text "7" at 15.08,-0.47 h0.8
  text "5" at 9.98,-0.37 h0.8
  text "1" at -0.1,-0.37 h0.8
  text "2" at 2.3,-0.37 h0.8
  text "3" at 4.88,-0.37 h0.8
  text "4" at 7.38,-0.37 h0.8
  text "6" at 12.45,-0.42 h0.8
  text "9" at 20.08,-0.47 h0.8
  text "8" at 17.48,-1.57 h0.8
  text "10" at 22.38,-0.27 h0.6
Mechanical 15:
  lines w0.2: -1.4,-1.4 -1.4,1.4 24.2,1.4 24.2,-1.4 -1.4,-1.4
3D body "BG075-10A-1-0600-0300-0150-N-G.stp": height 2.52, standoff -2.98, extent -1.27,-10.006 24.13,0.354

## Jump_1x15_F [mil]
pads (15):
  rect 70x70 hole 39.37 unplated: 1(510,450)
  round 70 hole 39.37 unplated: 2(510,350) 3(510,250) 4(510,150) 5(510,50) 6(510,-50) 7(510,-150) 8(510,-250) 9(510,-350) 10(510,-450) 11(510,-550) 12(510,-650) 13(510,-750) 14(510,-850) 15(510,-950)
Top Overlay:
  lines w7.87: 441.69,-1000 578.31,-1000 578.31,500 485,500 ccw(c510,500) 535,500 441.69,500 441.69,-1000

## Jump_2x3_J [mm]
pads (6):
  rect 3x1 smd: 1(3.073,-2.534) 2(-3.073,-2.534) 3(3.073,0) 4(-3.073,0) 5(3.073,2.534) 6(-3.073,2.534)
Top Overlay:
  lines w0.254: -5.08,-3.918 5.08,-3.918 5.08,3.918 -5.08,3.918 -5.08,-3.918
3D body "BG050-06A-0-1200-0737-0350-L-B.stp": height 15.49, standoff -0.01, extent -3.685,-3.81 3.685,3.81

## Jump_2x3_JJ [mm]
pads (6):
  rect 3x1 smd: 1(3.073,-2.534) 2(-3.073,-2.534) 3(3.073,0) 4(-3.073,0) 5(3.073,2.534) 6(-3.073,2.534)
Top Overlay:
  lines w0.254: -5.08,-3.918 5.08,-3.918 5.08,3.918 -5.08,3.918 -5.08,-3.918
3D body "BG180-06-A-0-N-C.stp": height 7.51, standoff 0.01, extent -3.371,-3.81 3.429,3.81

## JUMP_2X4_F [mm] "JUMP_1X4_2P54"
pads (8):
  round 1.6 hole 1 mask+0.1: 1(0,0) 2(0,2.54) 3(2.54,0) 4(2.54,2.54) 5(5.08,0) 6(5.08,2.54) 7(7.62,0) 8(7.62,2.54)
Top Overlay:
  circle w0.254: c-1.651,0.025 r0.1
  lines w0.3: -1.1,-0.78 -1.1,0.78 -0.78,1.1 0.78,1.1 1.1,0.78 1.1,-0.78 0.78,-1.1 -0.78,-1.1 -1.1,-0.78 ; -1.1,1.76 -1.1,3.32 -0.78,3.64 0.78,3.64 1.1,3.32 1.1,1.76 0.78,1.44 -0.78,1.44 -1.1,1.76 ; 1.44,-0.78 1.44,0.78 1.76,1.1 3.32,1.1 3.64,0.78 3.64,-0.78 3.32,-1.1 1.76,-1.1 1.44,-0.78 ; 1.44,1.76 1.44,3.32 1.76,3.64 3.32,3.64 3.64,3.32 3.64,1.76 3.32,1.44 1.76,1.44 1.44,1.76 ; 3.98,-0.78 3.98,0.78 4.3,1.1 5.86,1.1 6.18,0.78 6.18,-0.78 5.86,-1.1 4.3,-1.1 3.98,-0.78 ; 3.98,1.76 3.98,3.32 4.3,3.64 5.86,3.64 6.18,3.32 6.18,1.76 5.86,1.44 4.3,1.44 3.98,1.76 ; 6.52,-0.78 6.52,0.78 6.84,1.1 8.4,1.1 8.72,0.78 8.72,-0.78 8.4,-1.1 6.84,-1.1 6.52,-0.78 ; 6.52,1.76 6.52,3.32 6.84,3.64 8.4,3.64 8.72,3.32 8.72,1.76 8.4,1.44 6.84,1.44 6.52,1.76
Mechanical 1:
  circle w0.05: c0,2.54 r0.762
  circle w0.05: c2.54,2.54 r0.762
  circle w0.05: c5.08,2.54 r0.762
  circle w0.05: c7.62,2.54 r0.762
  circle w0.05: c0,0 r0.762
  circle w0.05: c2.54,0 r0.762
  circle w0.05: c5.08,0 r0.762
  circle w0.05: c7.62,0 r0.762
  lines w0.05: -1.1,-0.78 -0.78,-1.1 0.78,-1.1 1.1,-0.78 1.1,0.78 0.78,1.1 -0.78,1.1 -1.1,0.78 -1.1,-0.78 ; -1.1,1.76 -0.78,1.44 0.78,1.44 1.1,1.76 1.1,3.32 0.78,3.64 -0.78,3.64 -1.1,3.32 -1.1,1.76 ; 1.44,-0.78 1.76,-1.1 3.32,-1.1 3.64,-0.78 3.64,0.78 3.32,1.1 1.76,1.1 1.44,0.78 1.44,-0.78 ; 1.44,1.76 1.76,1.44 3.32,1.44 3.64,1.76 3.64,3.32 3.32,3.64 1.76,3.64 1.44,3.32 1.44,1.76 ; 3.98,-0.78 4.3,-1.1 5.86,-1.1 6.18,-0.78 6.18,0.78 5.86,1.1 4.3,1.1 3.98,0.78 3.98,-0.78 ; 3.98,1.76 4.3,1.44 5.86,1.44 6.18,1.76 6.18,3.32 5.86,3.64 4.3,3.64 3.98,3.32 3.98,1.76 ; 6.52,-0.78 6.84,-1.1 8.4,-1.1 8.72,-0.78 8.72,0.78 8.4,1.1 6.84,1.1 6.52,0.78 6.52,-0.78 ; 6.52,1.76 6.84,1.44 8.4,1.44 8.72,1.76 8.72,3.32 8.4,3.64 6.84,3.64 6.52,3.32 6.52,1.76
  text "1" at -0.17,2.18 h0.8
  text "2" at 2.23,2.18 h0.8
  text "3" at 4.83,2.18 h0.8
  text "4" at 7.33,2.18 h0.8
  text "1" at -0.17,-0.36 h0.8
  text "2" at 2.23,-0.36 h0.8
  text "3" at 4.83,-0.36 h0.8
  text "4" at 7.33,-0.36 h0.8
Mechanical 15:
  lines w0.2: -1.49,-1.448 -1.49,3.99 9.01,3.99 9.01,-1.448 -1.49,-1.448
3D body "BG150-08-A-0320-N-D.stp": height 8.55, standoff -3.15, extent -1.567,-1.23 9.093,3.77

## JUMP_2X4_H [mm] "JUMP_1X4_2P54"
pads (8):
  round 1.6 hole 1 mask+0.1: 1(0,0) 2(0,-2.54) 3(2.54,0) 4(2.54,-2.54) 5(5.08,0) 6(5.08,-2.54) 7(7.62,0) 8(7.62,-2.54)
Top Overlay:
  circle w0.254: c-1.69,0 r0.1
  lines w0.3: -1.1,-3.32 -1.1,-1.76 -0.78,-1.44 0.78,-1.44 1.1,-1.76 1.1,-3.32 0.78,-3.64 -0.78,-3.64 -1.1,-3.32 ; -1.1,-0.78 -1.1,0.78 -0.78,1.1 0.78,1.1 1.1,0.78 1.1,-0.78 0.78,-1.1 -0.78,-1.1 -1.1,-0.78 ; 1.44,-3.32 1.44,-1.76 1.76,-1.44 3.32,-1.44 3.64,-1.76 3.64,-3.32 3.32,-3.64 1.76,-3.64 1.44,-3.32 ; 1.44,-0.78 1.44,0.78 1.76,1.1 3.32,1.1 3.64,0.78 3.64,-0.78 3.32,-1.1 1.76,-1.1 1.44,-0.78 ; 3.98,-3.32 3.98,-1.76 4.3,-1.44 5.86,-1.44 6.18,-1.76 6.18,-3.32 5.86,-3.64 4.3,-3.64 3.98,-3.32 ; 3.98,-0.78 3.98,0.78 4.3,1.1 5.86,1.1 6.18,0.78 6.18,-0.78 5.86,-1.1 4.3,-1.1 3.98,-0.78 ; 6.52,-3.32 6.52,-1.76 6.84,-1.44 8.4,-1.44 8.72,-1.76 8.72,-3.32 8.4,-3.64 6.84,-3.64 6.52,-3.32 ; 6.52,-0.78 6.52,0.78 6.84,1.1 8.4,1.1 8.72,0.78 8.72,-0.78 8.4,-1.1 6.84,-1.1 6.52,-0.78
Mechanical 1:
  circle w0.05: c0,0 r0.762
  circle w0.05: c2.54,0 r0.762
  circle w0.05: c5.08,0 r0.762
  circle w0.05: c7.62,0 r0.762
  circle w0.05: c0,-2.54 r0.762
  circle w0.05: c2.54,-2.54 r0.762
  circle w0.05: c5.08,-2.54 r0.762
  circle w0.05: c7.62,-2.54 r0.762
  lines w0.05: -1.1,-3.32 -0.78,-3.64 0.78,-3.64 1.1,-3.32 1.1,-1.76 0.78,-1.44 -0.78,-1.44 -1.1,-1.76 -1.1,-3.32 ; -1.1,-0.78 -0.78,-1.1 0.78,-1.1 1.1,-0.78 1.1,0.78 0.78,1.1 -0.78,1.1 -1.1,0.78 -1.1,-0.78 ; 1.44,-3.32 1.76,-3.64 3.32,-3.64 3.64,-3.32 3.64,-1.76 3.32,-1.44 1.76,-1.44 1.44,-1.76 1.44,-3.32 ; 1.44,-0.78 1.76,-1.1 3.32,-1.1 3.64,-0.78 3.64,0.78 3.32,1.1 1.76,1.1 1.44,0.78 1.44,-0.78 ; 3.98,-3.32 4.3,-3.64 5.86,-3.64 6.18,-3.32 6.18,-1.76 5.86,-1.44 4.3,-1.44 3.98,-1.76 3.98,-3.32 ; 3.98,-0.78 4.3,-1.1 5.86,-1.1 6.18,-0.78 6.18,0.78 5.86,1.1 4.3,1.1 3.98,0.78 3.98,-0.78 ; 6.52,-3.32 6.84,-3.64 8.4,-3.64 8.72,-3.32 8.72,-1.76 8.4,-1.44 6.84,-1.44 6.52,-1.76 6.52,-3.32 ; 6.52,-0.78 6.84,-1.1 8.4,-1.1 8.72,-0.78 8.72,0.78 8.4,1.1 6.84,1.1 6.52,0.78 6.52,-0.78
  text "1" at -0.17,-0.36 h0.8
  text "2" at 2.23,-0.36 h0.8
  text "3" at 4.83,-0.36 h0.8
  text "4" at 7.33,-0.36 h0.8
  text "1" at -0.17,-2.9 h0.8
  text "2" at 2.23,-2.9 h0.8
  text "3" at 4.83,-2.9 h0.8
  text "4" at 7.33,-2.9 h0.8
Mechanical 15:
  lines w0.2: -1.49,-3.988 -1.49,1.45 9.01,1.45 9.01,-3.988 -1.49,-3.988
3D body "BG085-08-A-0600-0300-0120-N-G.stp": height 5.04, standoff -2.96, extent -1.321,-12.269 8.839,0.331

## Jump_2x4_J [mm]
pads (8):
  rect 3x1 smd: 1(3.073,-3.804) 2(-3.073,-3.804) 3(3.073,-1.27) 4(-3.073,-1.27) 5(3.073,1.264) 6(-3.073,1.264) 7(3.073,3.804) 8(-3.073,3.804)
Top Overlay:
  lines w0.254: -5.08,-5.188 5.08,-5.188 5.08,5.226 -5.08,5.226 -5.08,-5.188
3D body "BG050-08A-0-1500-0737-0350-L-B.stp": height 18.51, standoff 0.01, extent -3.685,-5.061 3.685,5.099